# Altium footprint library General.PcbLib: 446 footprints (part 21 of 28)
Each footprint in its own frame and in the unit in brackets; x right, y up, seen from the top. Pads: shape width x height; smd on the part's side, far side on the other; paste and mask are expansions set on the pad; w line width, h text height; cw(c..) or ccw(c..) is an arc to the next point about the centre after c.
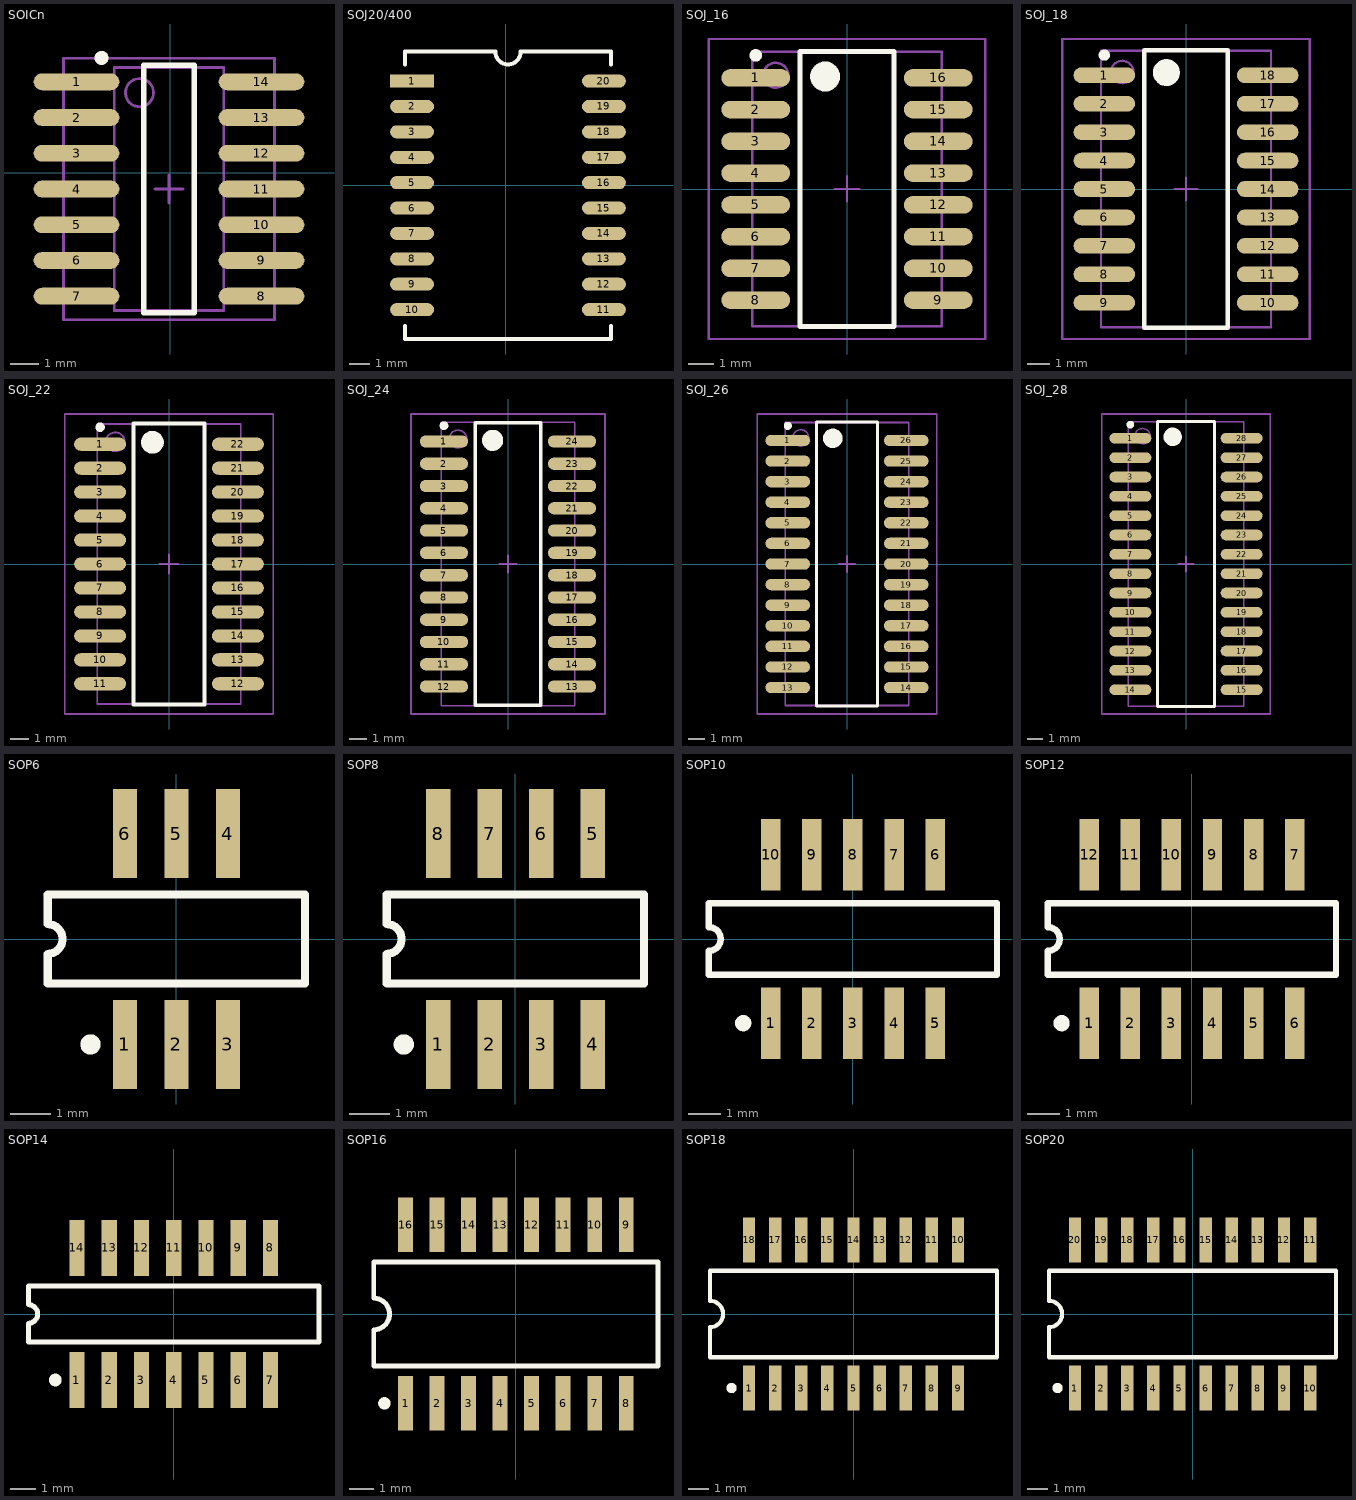
[diagram p20: the footprints below, top view; thin cyan lines are the x and y axes]

## SOICn [mil]
pads (14):
  oval 120x23.62 smd: 1(-131.49,127) 2(-131.49,77) 3(-131.49,27) 4(-131.49,-23) 5(-131.49,-73) 6(-131.49,-123) 7(-131.49,-173) 8(127.49,-173) 9(127.49,-123) 10(127.49,-73) 11(127.49,-23) 12(127.49,27) 13(127.49,77) 14(127.49,127)
Top Overlay:
  circle w9.84: c-96.49,160.46 r4.92
  lines w7.87: -37.43,-196.23 -37.43,150.23 33.43,150.23 33.43,-196.23 -37.43,-196.23
Mechanical 13:
  circle w3.94: c-43.34,111.84 r19.68
  lines w3.94: -78.77,-193.28 -78.77,147.28 74.77,147.28 74.77,-193.28 -78.77,-193.28
Mechanical 15:
  lines w3.94: -21.69,-23 17.69,-23 ; -2,-42.68 -2,-3.31 ; -149.64,-206.07 -149.64,160.07 145.64,160.07 145.64,-206.07 -149.64,-206.07
3D body: height 68.9, standoff 0, extent -78.77,-193.28 74.77,147.28

## SOJ20/400 [mm]
pads (20):
  rect 2.2x0.65 smd: 1(-4.699,5.207)
  oval 2.2x0.65 smd: 2(-4.699,3.937) 3(-4.699,2.667) 4(-4.699,1.397) 5(-4.699,0.127) 6(-4.699,-1.143) 7(-4.699,-2.413) 8(-4.699,-3.683) 9(-4.699,-4.953) 10(-4.699,-6.223) 11(4.901,-6.223) 12(4.901,-4.953) 13(4.901,-3.683) 14(4.901,-2.413) 15(4.901,-1.143) 16(4.901,0.127) 17(4.901,1.397) 18(4.901,2.667) 19(4.901,3.937) 20(4.901,5.207)
Top Overlay:
  lines w0.2: -5.044,-7.048 -5.044,-7.693 5.246,-7.693 5.246,-7.048 ; -5.044,6.032 -5.044,6.677 -0.534,6.677 ccw(c0.101,6.677) 0.736,6.677 5.246,6.677 5.246,6.032

## SOJ_16 [mm] "SOJ, 16-Leads, Body 11.0x8.9mm (max), Pitch 1.27mm, IPC Low Density"
height 3.75
pads (16):
  oval 2.75x0.7 smd: 1(-3.65,4.445) 2(-3.65,3.175) 3(-3.65,1.905) 4(-3.65,0.635) 5(-3.65,-0.635) 6(-3.65,-1.905) 7(-3.65,-3.175) 8(-3.65,-4.445) 9(3.65,-4.445) 10(3.65,-3.175) 11(3.65,-1.905) 12(3.65,-0.635) 13(3.65,0.635) 14(3.65,1.905) 15(3.65,3.175) 16(3.65,4.445)
Top Overlay:
  circle w0.6: c-0.875,4.5 r0.3
  circle w0.25: c-3.65,5.345 r0.125
  lines w0.2: -1.875,-5.5 1.875,-5.5 1.875,5.5 -1.875,5.5 -1.875,-5.5
Mechanical 13:
  circle w0.1: c-2.85,4.55 r0.5
  lines w0.1: -3.8,-5.5 3.8,-5.5 3.8,5.5 -3.8,5.5 -3.8,-5.5
Mechanical 15:
  lines w0.1: -0.5,0 0.5,0 ; 0,-0.5 0,0.5 ; -5.525,-6 5.525,-6 5.525,6 -5.525,6 -5.525,-6
3D body: height 3.75, standoff 2, extent -3.8,-5.5 3.8,5.5

## SOJ_18 [mm] "SOJ, 18-Leads, Body 12.4x8.9mm (max), Pitch 1.27mm, IPC Low Density"
height 3.75
pads (18):
  oval 2.75x0.7 smd: 1(-3.65,5.08) 2(-3.65,3.81) 3(-3.65,2.54) 4(-3.65,1.27) 5(-3.65,0) 6(-3.65,-1.27) 7(-3.65,-2.54) 8(-3.65,-3.81) 9(-3.65,-5.08) 10(3.65,-5.08) 11(3.65,-3.81) 12(3.65,-2.54) 13(3.65,-1.27) 14(3.65,0) 15(3.65,1.27) 16(3.65,2.54) 17(3.65,3.81) 18(3.65,5.08)
Top Overlay:
  circle w0.6: c-0.875,5.2 r0.3
  circle w0.25: c-3.65,5.98 r0.125
  lines w0.2: -1.875,-6.2 1.875,-6.2 1.875,6.2 -1.875,6.2 -1.875,-6.2
Mechanical 13:
  circle w0.1: c-2.85,5.225 r0.5
  lines w0.1: -3.8,-6.175 3.8,-6.175 3.8,6.175 -3.8,6.175 -3.8,-6.175
Mechanical 15:
  lines w0.1: -0.5,0 0.5,0 ; 0,-0.5 0,0.5 ; -5.525,-6.7 5.525,-6.7 5.525,6.7 -5.525,6.7 -5.525,-6.7
3D body: height 3.75, standoff 2, extent -3.8,-6.175 3.8,6.175

## SOJ_22 [mm] "SOJ, 22-Leads, Body 14.9x8.9mm (max), Pitch 1.27mm, IPC Low Density"
height 3.75
pads (22):
  oval 2.75x0.7 smd: 1(-3.65,6.35) 2(-3.65,5.08) 3(-3.65,3.81) 4(-3.65,2.54) 5(-3.65,1.27) 6(-3.65,0) 7(-3.65,-1.27) 8(-3.65,-2.54) 9(-3.65,-3.81) 10(-3.65,-5.08) 11(-3.65,-6.35) 12(3.65,-6.35) 13(3.65,-5.08) 14(3.65,-3.81) 15(3.65,-2.54) 16(3.65,-1.27) 17(3.65,0) 18(3.65,1.27) 19(3.65,2.54) 20(3.65,3.81) 21(3.65,5.08) 22(3.65,6.35)
Top Overlay:
  circle w0.6: c-0.875,6.45 r0.3
  circle w0.25: c-3.65,7.25 r0.125
  lines w0.2: -1.875,-7.45 1.875,-7.45 1.875,7.45 -1.875,7.45 -1.875,-7.45
Mechanical 13:
  circle w0.1: c-2.85,6.475 r0.5
  lines w0.1: -3.8,-7.425 3.8,-7.425 3.8,7.425 -3.8,7.425 -3.8,-7.425
Mechanical 15:
  lines w0.1: -0.5,0 0.5,0 ; 0,-0.5 0,0.5 ; -5.525,-7.95 5.525,-7.95 5.525,7.95 -5.525,7.95 -5.525,-7.95
3D body: height 3.75, standoff 2, extent -3.8,-7.425 3.8,7.425

## SOJ_24 [mm] "SOJ, 24-Leads, Body 16.1x8.9mm (max), Pitch 1.27mm, IPC Low Density"
height 3.75
pads (24):
  oval 2.75x0.7 smd: 1(-3.65,6.985) 2(-3.65,5.715) 3(-3.65,4.445) 4(-3.65,3.175) 5(-3.65,1.905) 6(-3.65,0.635) 7(-3.65,-0.635) 8(-3.65,-1.905) 9(-3.65,-3.175) 10(-3.65,-4.445) 11(-3.65,-5.715) 12(-3.65,-6.985) 13(3.65,-6.985) 14(3.65,-5.715) 15(3.65,-4.445) 16(3.65,-3.175) 17(3.65,-1.905) 18(3.65,-0.635) 19(3.65,0.635) 20(3.65,1.905) 21(3.65,3.175) 22(3.65,4.445) 23(3.65,5.715) 24(3.65,6.985)
Top Overlay:
  circle w0.25: c-3.65,7.885 r0.125
  circle w0.6: c-0.875,7.05 r0.3
  lines w0.2: -1.875,-8.05 -1.875,8.05 1.875,8.05 1.875,-8.05 -1.875,-8.05
Mechanical 13:
  circle w0.1: c-2.85,7.125 r0.5
  lines w0.1: -3.8,-8.075 -3.8,8.075 3.8,8.075 3.8,-8.075 -3.8,-8.075
Mechanical 15:
  lines w0.1: -0.5,0 0.5,0 ; 0,-0.5 0,0.5 ; -5.525,-8.55 -5.525,8.55 5.525,8.55 5.525,-8.55 -5.525,-8.55
3D body: height 3.75, standoff 2, extent -3.8,-8.075 3.8,8.075

## SOJ_26 [mm] "SOJ, 26-Leads, Body 17.5x8.9mm (max), Pitch 1.27mm, IPC Low Density"
height 3.75
pads (26):
  oval 2.75x0.7 smd: 1(-3.65,7.62) 2(-3.65,6.35) 3(-3.65,5.08) 4(-3.65,3.81) 5(-3.65,2.54) 6(-3.65,1.27) 7(-3.65,0) 8(-3.65,-1.27) 9(-3.65,-2.54) 10(-3.65,-3.81) 11(-3.65,-5.08) 12(-3.65,-6.35) 13(-3.65,-7.62) 14(3.65,-7.62) 15(3.65,-6.35) 16(3.65,-5.08) 17(3.65,-3.81) 18(3.65,-2.54) 19(3.65,-1.27) 20(3.65,0) 21(3.65,1.27) 22(3.65,2.54) 23(3.65,3.81) 24(3.65,5.08) 25(3.65,6.35) 26(3.65,7.62)
Top Overlay:
  circle w0.6: c-0.875,7.75 r0.3
  circle w0.25: c-3.65,8.52 r0.125
  lines w0.2: -1.875,-8.75 1.875,-8.75 1.875,8.75 -1.875,8.75 -1.875,-8.75
Mechanical 13:
  circle w0.1: c-2.85,7.775 r0.5
  lines w0.1: -3.8,-8.725 3.8,-8.725 3.8,8.725 -3.8,8.725 -3.8,-8.725
Mechanical 15:
  lines w0.1: -0.5,0 0.5,0 ; 0,-0.5 0,0.5 ; -5.525,-9.25 5.525,-9.25 5.525,9.25 -5.525,9.25 -5.525,-9.25
3D body: height 3.75, standoff 2, extent -3.8,-8.725 3.8,8.725

## SOJ_28 [mm] "SOJ, 28-Leads, Body 18.7x8.9mm (max), Pitch 1.27mm, IPC Low Density"
height 3.75
pads (28):
  oval 2.75x0.7 smd: 1(-3.65,8.255) 2(-3.65,6.985) 3(-3.65,5.715) 4(-3.65,4.445) 5(-3.65,3.175) 6(-3.65,1.905) 7(-3.65,0.635) 8(-3.65,-0.635) 9(-3.65,-1.905) 10(-3.65,-3.175) 11(-3.65,-4.445) 12(-3.65,-5.715) 13(-3.65,-6.985) 14(-3.65,-8.255) 15(3.65,-8.255) 16(3.65,-6.985) 17(3.65,-5.715) 18(3.65,-4.445) 19(3.65,-3.175) 20(3.65,-1.905) 21(3.65,-0.635) 22(3.65,0.635) 23(3.65,1.905) 24(3.65,3.175) 25(3.65,4.445) 26(3.65,5.715) 27(3.65,6.985) 28(3.65,8.255)
Top Overlay:
  circle w0.6: c-0.875,8.35 r0.3
  circle w0.25: c-3.65,9.155 r0.125
  lines w0.2: -1.875,-9.35 1.875,-9.35 1.875,9.35 -1.875,9.35 -1.875,-9.35
Mechanical 13:
  circle w0.1: c-2.85,8.4 r0.5
  lines w0.1: -3.8,-9.35 3.8,-9.35 3.8,9.35 -3.8,9.35 -3.8,-9.35
Mechanical 15:
  lines w0.1: -0.5,0 0.5,0 ; 0,-0.5 0,0.5 ; -5.525,-9.85 5.525,-9.85 5.525,9.85 -5.525,9.85 -5.525,-9.85
3D body: height 3.75, standoff 2, extent -3.8,-9.35 3.8,9.35

## SOP6 [mm] "Small Outline; 6 Leads; Body Width 4.3 mm; Pitch 1.27 mm"
height 1.5
pads (6):
  rect 0.6x2.2 smd: 1(-1.27,-2.6) 2(0,-2.6) 3(1.27,-2.6) 4(1.27,2.6) 5(0,2.6) 6(-1.27,2.6)
Top Overlay:
  circle w0.25: c-2.12,-2.6 r0.125
  lines w0.2: -3.175,-1.1 -3.175,-0.367 ccw(c-3.175,0) -3.175,0.367 -3.175,1.1 3.175,1.1 3.175,-1.1 -3.175,-1.1

## SOP8 [mm] "Small Outline; 8 Leads; Body Width 4.3 mm; Pitch 1.27 mm"
height 1.5
pads (8):
  rect 0.6x2.2 smd: 1(-1.905,-2.6) 2(-0.635,-2.6) 3(0.635,-2.6) 4(1.905,-2.6) 5(1.905,2.6) 6(0.635,2.6) 7(-0.635,2.6) 8(-1.905,2.6)
Top Overlay:
  circle w0.25: c-2.755,-2.6 r0.125
  lines w0.2: -3.175,-1.1 -3.175,-0.367 ccw(c-3.175,0) -3.175,0.367 -3.175,1.1 3.175,1.1 3.175,-1.1 -3.175,-1.1

## SOP10 [mm] "Small Outline; 10 Leads; Body Width 4.3 mm; Pitch 1.27 mm"
height 1.5
pads (10):
  rect 0.6x2.2 smd: 1(-2.54,-2.6) 2(-1.27,-2.6) 3(0,-2.6) 4(1.27,-2.6) 5(2.54,-2.6) 6(2.54,2.6) 7(1.27,2.6) 8(0,2.6) 9(-1.27,2.6) 10(-2.54,2.6)
Top Overlay:
  circle w0.25: c-3.39,-2.6 r0.125
  lines w0.2: -4.45,-1.1 -4.45,-0.367 ccw(c-4.45,0) -4.45,0.367 -4.45,1.1 4.45,1.1 4.45,-1.1 -4.45,-1.1

## SOP12 [mm] "Small Outline; 12 Leads; Body Width 4.3 mm; Pitch 1.27 mm"
height 1.5
pads (12):
  rect 0.6x2.2 smd: 1(-3.175,-2.6) 2(-1.905,-2.6) 3(-0.635,-2.6) 4(0.635,-2.6) 5(1.905,-2.6) 6(3.175,-2.6) 7(3.175,2.6) 8(1.905,2.6) 9(0.635,2.6) 10(-0.635,2.6) 11(-1.905,2.6) 12(-3.175,2.6)
Top Overlay:
  circle w0.25: c-4.025,-2.6 r0.125
  lines w0.2: -4.45,-1.1 4.45,-1.1 4.45,1.1 -4.45,1.1 -4.45,0.367 cw(c-4.45,0) -4.45,-0.367 -4.45,-1.1

## SOP14 [mm] "Small Outline; 14 Leads; Body Width 4.3 mm; Pitch 1.27 mm"
height 1.5
pads (14):
  rect 0.6x2.2 smd: 1(-3.81,-2.6) 2(-2.54,-2.6) 3(-1.27,-2.6) 4(0,-2.6) 5(1.27,-2.6) 6(2.54,-2.6) 7(3.81,-2.6) 8(3.81,2.6) 9(2.54,2.6) 10(1.27,2.6) 11(0,2.6) 12(-1.27,2.6) 13(-2.54,2.6) 14(-3.81,2.6)
Top Overlay:
  circle w0.25: c-4.66,-2.6 r0.125
  lines w0.2: -5.725,-1.1 -5.725,-0.367 ccw(c-5.725,0) -5.725,0.367 -5.725,1.1 5.725,1.1 5.725,-1.1 -5.725,-1.1

## SOP16 [mm] "Small Outline; 16 Leads; Body Width 5.6 mm; Pitch 1.27 mm"
height 2
pads (16):
  rect 0.6x2.2 smd: 1(-4.445,-3.6) 2(-3.175,-3.6) 3(-1.905,-3.6) 4(-0.635,-3.6) 5(0.635,-3.6) 6(1.905,-3.6) 7(3.175,-3.6) 8(4.445,-3.6) 9(4.445,3.6) 10(3.175,3.6) 11(1.905,3.6) 12(0.635,3.6) 13(-0.635,3.6) 14(-1.905,3.6) 15(-3.175,3.6) 16(-4.445,3.6)
Top Overlay:
  circle w0.25: c-5.295,-3.6 r0.125
  lines w0.2: -5.725,-2.1 -5.725,-0.635 ccw(c-5.725,0) -5.725,0.635 -5.725,2.1 5.725,2.1 5.725,-2.1 -5.725,-2.1

## SOP18 [mm] "Small Outline; 18 Leads; Body Width 5.6 mm; Pitch 1.27 mm"
height 2
pads (18):
  rect 0.6x2.2 smd: 1(-5.08,-3.6) 2(-3.81,-3.6) 3(-2.54,-3.6) 4(-1.27,-3.6) 5(0,-3.6) 6(1.27,-3.6) 7(2.54,-3.6) 8(3.81,-3.6) 9(5.08,-3.6) 10(5.08,3.6) 11(3.81,3.6) 12(2.54,3.6) 13(1.27,3.6) 14(0,3.6) 15(-1.27,3.6) 16(-2.54,3.6) 17(-3.81,3.6) 18(-5.08,3.6)
Top Overlay:
  circle w0.25: c-5.93,-3.6 r0.125
  lines w0.2: -6.975,-2.1 6.975,-2.1 6.975,2.1 -6.975,2.1 -6.975,0.635 cw(c-6.975,0) -6.975,-0.635 -6.975,-2.1

## SOP20 [mm] "Small Outline; 20 Leads; Body Width 5.6 mm; Pitch 1.27 mm"
height 2
pads (20):
  rect 0.6x2.2 smd: 1(-5.715,-3.6) 2(-4.445,-3.6) 3(-3.175,-3.6) 4(-1.905,-3.6) 5(-0.635,-3.6) 6(0.635,-3.6) 7(1.905,-3.6) 8(3.175,-3.6) 9(4.445,-3.6) 10(5.715,-3.6) 11(5.715,3.6) 12(4.445,3.6) 13(3.175,3.6) 14(1.905,3.6) 15(0.635,3.6) 16(-0.635,3.6) 17(-1.905,3.6) 18(-3.175,3.6) 19(-4.445,3.6) 20(-5.715,3.6)
Top Overlay:
  circle w0.25: c-6.565,-3.6 r0.125
  lines w0.2: -6.975,-2.1 -6.975,-0.635 ccw(c-6.975,0) -6.975,0.635 -6.975,2.1 6.975,2.1 6.975,-2.1 -6.975,-2.1